# Altium footprint library sun_library.PcbLib: 412 footprints (part 24 of 26)
Each footprint in its own frame and in the unit in brackets; x right, y up, seen from the top. Pads: shape width x height; smd on the part's side, far side on the other; paste and mask are expansions set on the pad; w line width, h text height; cw(c..) or ccw(c..) is an arc to the next point about the centre after c.
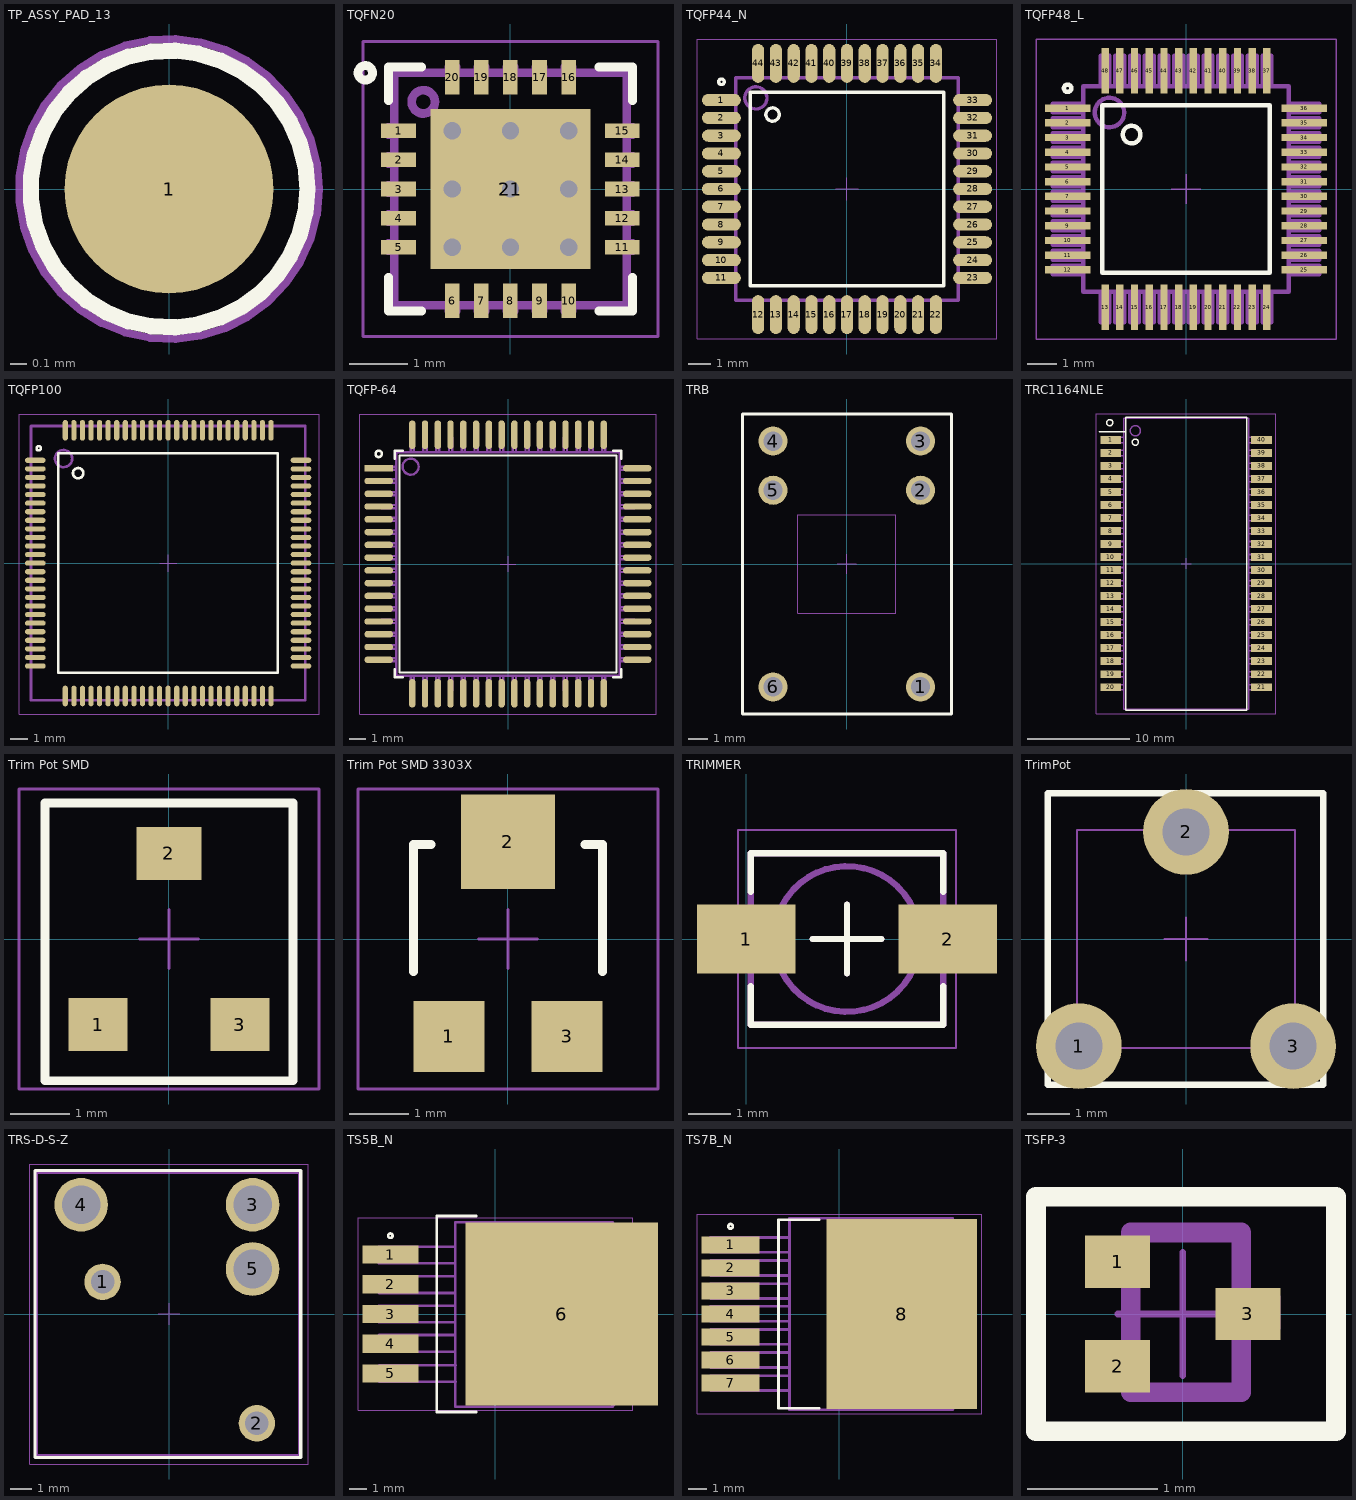
[diagram p23: the footprints below, top view; thin cyan lines are the x and y axes]

## TP_ASSY_PAD_13 [mm]
pads (1):
  round 1.3 smd paste-0.65: 1(0,0)
Top Overlay:
  circle w0.1: c0,0 r0.86
CourtTop 15:
  circle w0.05: c0,0 r0.932
3D body "Test_Pad_130x001.STEP": height 0.01, standoff 0, extent -0.65,-0.65 0.65,0.65

## TQFN20 [mm] "20-Pin Plastic Quad 4x4 Flat No-Lead 0.5 mm Pitch, IPC Low Density"
height 1
pads (21):
  rect 0.6x0.25 smd mask+0.05: 1(-1.925,1) 2(-1.925,0.5) 3(-1.925,0) 4(-1.925,-0.5) 5(-1.925,-1) 11(1.925,-1) 12(1.925,-0.5) 13(1.925,0) 14(1.925,0.5) 15(1.925,1)
  rect 0.25x0.6 smd mask+0.05: 6(-1,-1.925) 7(-0.5,-1.925) 8(0,-1.925) 9(0.5,-1.925) 10(1,-1.925) 16(1,1.925) 17(0.5,1.925) 18(0,1.925) 19(-0.5,1.925) 20(-1,1.925)
  rect 2.75x2.75 smd paste-2 mask+0.05: 21(0,0)
via 1,-1 diameter 0.6 hole 0.3
via 0,-1 diameter 0.6 hole 0.3
via -1,-1 diameter 0.6 hole 0.3
via -1,0 diameter 0.6 hole 0.3
via 0,0 diameter 0.6 hole 0.3
via 1,0 diameter 0.6 hole 0.3
via 1,1 diameter 0.6 hole 0.3
via 0,1 diameter 0.6 hole 0.3
via -1,1 diameter 0.6 hole 0.3
Top Overlay:
  circle w0.15: c-2.5,2 r0.125
  lines w0.15: -2.1,-1.525 -2.1,-2.1 -1.525,-2.1 ; -2.1,1.525 -2.1,2.1 -1.525,2.1 ; 1.525,-2.1 2.1,-2.1 2.1,-1.525 ; 1.525,2.1 2.1,2.1 2.1,1.525
Top Paste:
  rectangle: 0.1,-0.9 0.9,-0.1
  rectangle: -0.9,-0.9 -0.1,-0.1
  rectangle: 0.1,0.1 0.9,0.9
  rectangle: -0.9,0.1 -0.1,0.9
Bottom Solder:
  rectangle: -1.4,-1.4 1.4,1.4
TopAssy 13:
  circle w0.15: c-1.5,1.5 r0.2
  lines w0.15: -2.1,-1.063 -2.1,-0.938 ; -2.1,-0.563 -2.1,-0.437 ; -2.1,-0.063 -2.1,0.062 ; -2.1,0.437 -2.1,0.562 ; -2.1,0.937 -2.1,1.062 ; -1.062,-2.1 -0.937,-2.1 ; -1.062,2.1 -0.937,2.1 ; -0.562,-2.1 -0.437,-2.1 ; -0.562,2.1 -0.437,2.1 ; -0.062,-2.1 0.063,-2.1 ; -0.062,2.1 0.063,2.1 ; 0.437,-2.1 0.563,-2.1 ; 0.437,2.1 0.563,2.1 ; 0.938,-2.1 1.063,-2.1 ; 0.937,2.1 1.062,2.1 ; 2.1,-1.062 2.1,-0.937 ; 2.1,-0.562 2.1,-0.437 ; 2.1,-0.062 2.1,0.063 ; 2.1,0.437 2.1,0.563 ; 2.1,0.938 2.1,1.063 ; -2,-2 2,-2 2,2 -2,2 -2,-2
CourtTop 15:
  lines w0.05: -0.5,0 0.5,0 ; 0,-0.5 0,-0.25 0,0.25 0,0.5 ; -2.54,-2.54 2.54,-2.54 2.54,2.54 -2.54,2.54 -2.54,-2.54
3D body "User Library-qfn20-4x4.step": height 0.92, standoff 0, extent -2,-2.01 2,1.99

## TQFP44_N [mm] "Thin QFP, 44-Leads, Body 10x10mm, Pitch 0.8mm, IPC Medium Density"
height 1.2
pads (44):
  oval 1.75x0.55 smd: 1(-5.65,4) 2(-5.65,3.2) 3(-5.65,2.4) 4(-5.65,1.6) 5(-5.65,0.8) 6(-5.65,0) 7(-5.65,-0.8) 8(-5.65,-1.6) 9(-5.65,-2.4) 10(-5.65,-3.2) 11(-5.65,-4) 23(5.65,-4) 24(5.65,-3.2) 25(5.65,-2.4) 26(5.65,-1.6) 27(5.65,-0.8) 28(5.65,0) 29(5.65,0.8) 30(5.65,1.6) 31(5.65,2.4) 32(5.65,3.2) 33(5.65,4)
  oval 0.55x1.75 smd: 12(-4,-5.65) 13(-3.2,-5.65) 14(-2.4,-5.65) 15(-1.6,-5.65) 16(-0.8,-5.65) 17(0,-5.65) 18(0.8,-5.65) 19(1.6,-5.65) 20(2.4,-5.65) 21(3.2,-5.65) 22(4,-5.65) 34(4,5.65) 35(3.2,5.65) 36(2.4,5.65) 37(1.6,5.65) 38(0.8,5.65) 39(0,5.65) 40(-0.8,5.65) 41(-1.6,5.65) 42(-2.4,5.65) 43(-3.2,5.65) 44(-4,5.65)
Top Overlay:
  circle w0.15: c-5.65,4.825 r0.125
  circle w0.15: c-3.35,3.35 r0.3
  lines w0.15: -4.35,-4.35 -4.35,4.35 4.35,4.35 4.35,-4.35 -4.35,-4.35
TopAssy 13:
  circle w0.15: c-4.1,4.1 r0.5
  lines w0.15: -5,-5 -5,5 5,5 5,-5 -5,-5
CourtTop 15:
  lines w0.05: -0.5,0 0.5,0 ; 0,-0.5 0,0.5 ; -6.75,-6.75 -6.75,6.75 6.75,6.75 6.75,-6.75 -6.75,-6.75
3D body "User Library-TQFP-44.STEP": height 1.05, standoff -0.01, extent -6,-6 6,6

## TQFP48_L [mm]
pads (48):
  rect 1.55x0.25 smd mask+0.075: 1(-4.025,2.75) 2(-4.025,2.25) 3(-4.025,1.75) 4(-4.025,1.25) 5(-4.025,0.75) 6(-4.025,0.25) 7(-4.025,-0.25) 8(-4.025,-0.75) 9(-4.025,-1.25) 10(-4.025,-1.75) 11(-4.025,-2.25) 12(-4.025,-2.75) 25(4.025,-2.75) 26(4.025,-2.25) 27(4.025,-1.75) 28(4.025,-1.25) 29(4.025,-0.75) 30(4.025,-0.25) 31(4.025,0.25) 32(4.025,0.75) 33(4.025,1.25) 34(4.025,1.75) 35(4.025,2.25) 36(4.025,2.75)
  rect 0.25x1.55 smd mask+0.075: 13(-2.75,-4.025) 14(-2.25,-4.025) 15(-1.75,-4.025) 16(-1.25,-4.025) 17(-0.75,-4.025) 18(-0.25,-4.025) 19(0.25,-4.025) 20(0.75,-4.025) 21(1.25,-4.025) 22(1.75,-4.025) 23(2.25,-4.025) 24(2.75,-4.025) 37(2.75,4.025) 38(2.25,4.025) 39(1.75,4.025) 40(1.25,4.025) 41(0.75,4.025) 42(0.25,4.025) 43(-0.25,4.025) 44(-0.75,4.025) 45(-1.25,4.025) 46(-1.75,4.025) 47(-2.25,4.025) 48(-2.75,4.025)
Top Overlay:
  circle w0.15: c-1.85,1.85 r0.3
  circle w0.15: c-4.025,3.425 r0.125
  lines w0.15: -2.85,-2.85 2.85,-2.85 2.85,2.85 -2.85,2.85 -2.85,-2.85
TopAssy 13:
  circle w0.15: c-2.6,2.6 r0.5
  lines w0.15: -3.5,-2.9 -4.525,-2.9 -4.525,-2.6 -3.5,-2.6 ; -3.5,-2.4 -4.525,-2.4 -4.525,-2.1 -3.5,-2.1 ; -3.5,-1.9 -4.525,-1.9 -4.525,-1.6 -3.5,-1.6 ; -3.5,-1.4 -4.525,-1.4 -4.525,-1.1 -3.5,-1.1 ; -3.5,-0.9 -4.525,-0.9 -4.525,-0.6 -3.5,-0.6 ; -3.5,-0.4 -4.525,-0.4 -4.525,-0.1 -3.5,-0.1 ; -3.5,0.1 -4.525,0.1 -4.525,0.4 -3.5,0.4 ; -3.5,0.6 -4.525,0.6 -4.525,0.9 -3.5,0.9 ; -3.5,1.1 -4.525,1.1 -4.525,1.4 -3.5,1.4 ; -3.5,1.6 -4.525,1.6 -4.525,1.9 -3.5,1.9 ; -3.5,2.1 -4.525,2.1 -4.525,2.4 -3.5,2.4 ; -3.5,2.6 -4.525,2.6 -4.525,2.9 -3.5,2.9 ; -2.9,-3.5 -2.9,-4.525 -2.6,-4.525 -2.6,-3.5 ; -2.9,3.5 -2.9,4.525 -2.6,4.525 -2.6,3.5 ; -2.4,-3.5 -2.4,-4.525 -2.1,-4.525 -2.1,-3.5 ; -2.4,3.5 -2.4,4.525 -2.1,4.525 -2.1,3.5 ; -1.9,-3.5 -1.9,-4.525 -1.6,-4.525 -1.6,-3.5 ; -1.9,3.5 -1.9,4.525 -1.6,4.525 -1.6,3.5 ; -1.4,-3.5 -1.4,-4.525 -1.1,-4.525 -1.1,-3.5 ; -1.4,3.5 -1.4,4.525 -1.1,4.525 -1.1,3.5 ; -0.9,-3.5 -0.9,-4.525 -0.6,-4.525 -0.6,-3.5 ; -0.9,3.5 -0.9,4.525 -0.6,4.525 -0.6,3.5 ; -0.4,-3.5 -0.4,-4.525 -0.1,-4.525 -0.1,-3.5 ; -0.4,3.5 -0.4,4.525 -0.1,4.525 -0.1,3.5 ; 0.1,-3.5 0.1,-4.525 0.4,-4.525 0.4,-3.5 ; 0.1,3.5 0.1,4.525 0.4,4.525 0.4,3.5 ; 0.6,-3.5 0.6,-4.525 0.9,-4.525 0.9,-3.5 ; 0.6,3.5 0.6,4.525 0.9,4.525 0.9,3.5 ; 1.1,-3.5 1.1,-4.525 1.4,-4.525 1.4,-3.5 ; 1.1,3.5 1.1,4.525 1.4,4.525 1.4,3.5 ; 1.6,-3.5 1.6,-4.525 1.9,-4.525 1.9,-3.5 ; 1.6,3.5 1.6,4.525 1.9,4.525 1.9,3.5 ; 2.1,-3.5 2.1,-4.525 2.4,-4.525 2.4,-3.5 ; 2.1,3.5 2.1,4.525 2.4,4.525 2.4,3.5 ; 2.6,-3.5 2.6,-4.525 2.9,-4.525 2.9,-3.5 ; 2.6,3.5 2.6,4.525 2.9,4.525 2.9,3.5 ; 3.5,-2.9 4.525,-2.9 4.525,-2.6 3.5,-2.6 ; 3.5,-2.4 4.525,-2.4 4.525,-2.1 3.5,-2.1 ; 3.5,-1.9 4.525,-1.9 4.525,-1.6 3.5,-1.6 ; 3.5,-1.4 4.525,-1.4 4.525,-1.1 3.5,-1.1 ; 3.5,-0.9 4.525,-0.9 4.525,-0.6 3.5,-0.6 ; 3.5,-0.4 4.525,-0.4 4.525,-0.1 3.5,-0.1 ; 3.5,0.1 4.525,0.1 4.525,0.4 3.5,0.4 ; 3.5,0.6 4.525,0.6 4.525,0.9 3.5,0.9 ; 3.5,1.1 4.525,1.1 4.525,1.4 3.5,1.4 ; 3.5,1.6 4.525,1.6 4.525,1.9 3.5,1.9 ; 3.5,2.1 4.525,2.1 4.525,2.4 3.5,2.4 ; 3.5,2.6 4.525,2.6 4.525,2.9 3.5,2.9 ; -3.5,-3.5 3.5,-3.5 3.5,3.5 -3.5,3.5 -3.5,-3.5
CourtTop 15:
  lines w0.05: -0.5,0 0.5,0 ; 0,-0.5 0,0.5 ; -5.1,-5.1 5.1,-5.1 5.1,5.1 -5.1,5.1 -5.1,-5.1
3D body "User Library-TQFP-48.STEP": height 1.45, standoff -0.01, extent -4.5,-4.5 4.5,4.5

## TQFP100 [mm] "Thin QFP, 100-Leads, Body 14x14mm, Pitch 0.5mm, IPC Medium Density"
height 1.6
pads (100):
  oval 1.2x0.3 smd: 1(-7.75,6) 2(-7.75,5.5) 3(-7.75,5) 4(-7.75,4.5) 5(-7.75,4) 6(-7.75,3.5) 7(-7.75,3) 8(-7.75,2.5) 9(-7.75,2) 10(-7.75,1.5) 11(-7.75,1) 12(-7.75,0.5) 13(-7.75,0) 14(-7.75,-0.5) 15(-7.75,-1) 16(-7.75,-1.5) 17(-7.75,-2) 18(-7.75,-2.5) 19(-7.75,-3) 20(-7.75,-3.5) 21(-7.75,-4) 22(-7.75,-4.5) 23(-7.75,-5) 24(-7.75,-5.5) 25(-7.75,-6) 51(7.75,-6) 52(7.75,-5.5) 53(7.75,-5) 54(7.75,-4.5) 55(7.75,-4) 56(7.75,-3.5) 57(7.75,-3) 58(7.75,-2.5) 59(7.75,-2) 60(7.75,-1.5) 61(7.75,-1) 62(7.75,-0.5) 63(7.75,0) 64(7.75,0.5) 65(7.75,1) 66(7.75,1.5) 67(7.75,2) 68(7.75,2.5) 69(7.75,3) 70(7.75,3.5) 71(7.75,4) 72(7.75,4.5) 73(7.75,5) 74(7.75,5.5) 75(7.75,6)
  oval 0.3x1.2 smd: 26(-6,-7.75) 27(-5.5,-7.75) 28(-5,-7.75) 29(-4.5,-7.75) 30(-4,-7.75) 31(-3.5,-7.75) 32(-3,-7.75) 33(-2.5,-7.75) 34(-2,-7.75) 35(-1.5,-7.75) 36(-1,-7.75) 37(-0.5,-7.75) 38(0,-7.75) 39(0.5,-7.75) 40(1,-7.75) 41(1.5,-7.75) 42(2,-7.75) 43(2.5,-7.75) 44(3,-7.75) 45(3.5,-7.75) 46(4,-7.75) 47(4.5,-7.75) 48(5,-7.75) 49(5.5,-7.75) 50(6,-7.75) 76(6,7.75) 77(5.5,7.75) 78(5,7.75) 79(4.5,7.75) 80(4,7.75) 81(3.5,7.75) 82(3,7.75) 83(2.5,7.75) 84(2,7.75) 85(1.5,7.75) 86(1,7.75) 87(0.5,7.75) 88(0,7.75) 89(-0.5,7.75) 90(-1,7.75) 91(-1.5,7.75) 92(-2,7.75) 93(-2.5,7.75) 94(-3,7.75) 95(-3.5,7.75) 96(-4,7.75) 97(-4.5,7.75) 98(-5,7.75) 99(-5.5,7.75) 100(-6,7.75)
Top Overlay:
  circle w0.15: c-7.55,6.7 r0.125
  circle w0.15: c-5.25,5.25 r0.3
  lines w0.15: -6.4,-6.4 -6.4,6.4 6.4,6.4 6.4,-6.4 -6.4,-6.4
TopAssy 13:
  circle w0.15: c-6.1,6.1 r0.5
  lines w0.15: -8,-8 -8,8 8,8 8,-8 -8,-8
CourtTop 15:
  lines w0.05: -0.5,0 0.5,0 ; 0,-0.5 0,0.5 ; -8.7,-8.8 -8.7,8.7 8.8,8.7 8.8,-8.8 -8.7,-8.8
3D body "User Library-TQFP100-2.step": height 1.1, standoff 0, extent -8.009,-8.008 8.009,8.009

## TQFP-64 [mm]
pads (64):
  rect 1.8x0.4 smd: 1(-8.1,6)
  oval 1.8x0.4 smd: 2(-8.1,5.2) 3(-8.1,4.4) 4(-8.1,3.6) 5(-8.1,2.8) 6(-8.1,2) 7(-8.1,1.2) 8(-8.1,0.4) 9(-8.1,-0.4) 10(-8.1,-1.2) 11(-8.1,-2) 12(-8.1,-2.8) 13(-8.1,-3.6) 14(-8.1,-4.4) 15(-8.1,-5.2) 16(-8.1,-6) 33(8.1,-6) 34(8.1,-5.2) 35(8.1,-4.4) 36(8.1,-3.6) 37(8.1,-2.8) 38(8.1,-2) 39(8.1,-1.2) 40(8.1,-0.4) 41(8.1,0.4) 42(8.1,1.2) 43(8.1,2) 44(8.1,2.8) 45(8.1,3.6) 46(8.1,4.4) 47(8.1,5.2) 48(8.1,6)
  oval 0.4x1.8 smd: 17(-6,-8.1) 18(-5.2,-8.1) 19(-4.4,-8.1) 20(-3.6,-8.1) 21(-2.8,-8.1) 22(-2,-8.1) 23(-1.2,-8.1) 24(-0.4,-8.1) 25(0.4,-8.1) 26(1.2,-8.1) 27(2,-8.1) 28(2.8,-8.1) 29(3.6,-8.1) 30(4.4,-8.1) 31(5.2,-8.1) 32(6,-8.1) 49(6,8.1) 50(5.2,8.1) 51(4.4,8.1) 52(3.6,8.1) 53(2.8,8.1) 54(2,8.1) 55(1.2,8.1) 56(0.4,8.1) 57(-0.4,8.1) 58(-1.2,8.1) 59(-2,8.1) 60(-2.8,8.1) 61(-3.6,8.1) 62(-4.4,8.1) 63(-5.2,8.1) 64(-6,8.1)
Top Overlay:
  circle w0.15: c-8.1,6.9 r0.2
  lines w0.15: -7.1,-6.6 -7.1,-7.1 -6.6,-7.1 ; -7.1,6.6 -7.1,7.1 -6.6,7.1 ; 6.6,-7.1 7.1,-7.1 7.1,-6.6 ; 6.6,7.1 7.1,7.1 7.1,6.6 ; -6.8,-6.8 -6.8,6.8 6.8,6.8 6.8,-6.8 -6.8,-6.8
TopAssy 13:
  drawing of 261 lines, arcs and shapes, not listed
CourtTop 15:
  lines w0.05: -0.5,0 0.5,0 ; 0,-0.5 0,0.5 ; -9.3,-9.4 9.3,-9.4 9.3,9.4 -9.3,9.4 -9.3,-9.4
3D body "User Library-TQFP 64 14x14mm 0_8mm pitch.step": height 1.5, standoff 0, extent -8,-8 8,8

## TRB [mm] "Реле серии TRB производитель TII"
height 11.8
pads (6):
  round 1.5 hole 1: 1(3.81,-6.35) 2(3.81,3.81) 3(3.81,6.35) 4(-3.81,6.35) 5(-3.81,3.81) 6(-3.81,-6.35)
Top Overlay:
  lines w0.15: -5.39,-7.75 -5.39,7.75 5.41,7.75 5.41,-7.75 -5.39,-7.75
CourtTop 15:
  lines w0.05: -0.5,0 0.5,0 ; 0,-0.5 0,-0.25 0,0.25 0,0.5 ; -2.54,-2.54 -2.54,2.54 2.54,2.54 2.54,-2.54 -2.54,-2.54

## TRC1164NLE [mm] "Ethernet transformer TRC1164NLE Trxcom"
height 1.1
pads (40):
  rect 2.03x0.76 smd: 1(-7.365,12.065) 2(-7.365,10.795) 3(-7.365,9.525) 4(-7.365,8.255) 5(-7.365,6.985) 6(-7.365,5.715) 7(-7.365,4.445) 8(-7.365,3.175) 9(-7.365,1.905) 10(-7.365,0.635) 11(-7.365,-0.635) 12(-7.365,-1.905) 13(-7.365,-3.175) 14(-7.365,-4.445) 15(-7.365,-5.715) 16(-7.365,-6.985) 17(-7.365,-8.255) 18(-7.365,-9.525) 19(-7.365,-10.795) 20(-7.365,-12.065) 21(7.365,-12.065) 22(7.365,-10.795) 23(7.365,-9.525) 24(7.365,-8.255) 25(7.365,-6.985) 26(7.365,-5.715) 27(7.365,-4.445) 28(7.365,-3.175) 29(7.365,-1.905) 30(7.365,-0.635) 31(7.365,0.635) 32(7.365,1.905) 33(7.365,3.175) 34(7.365,4.445) 35(7.365,5.715) 36(7.365,6.985) 37(7.365,8.255) 38(7.365,9.525) 39(7.365,10.795) 40(7.365,12.065)
Top Overlay:
  circle w0.15: c-7.465,13.75 r0.3
  circle w0.15: c-4.965,11.85 r0.3
  lines w0.15: -8.465,12.85 -5.965,12.85 ; -5.9,-14.3 -5.9,14.3 5.9,14.3 5.9,-14.3 -5.9,-14.3
TopAssy 13:
  drawing of 325 lines, arcs and shapes, not listed
CourtTop 15:
  lines w0.05: -0.5,0 0.5,0 ; 0,-0.5 0,0.5 ; -8.765,-14.685 -8.765,14.6 8.735,14.6 8.735,-14.685 -8.765,-14.685
3D body "SM51589EL.STP": height 6.01, standoff 0.01, extent -7.875,-13.835 8.075,3.715
3D body "SM51589EL.STP": height 6.01, standoff 0.01, extent -7.875,-3.675 8.075,13.875

## Trim Pot SMD [mm]
pads (3):
  rect 1x0.9 smd: 1(-1.2,-1.45) 3(1.2,-1.45)
  rect 1.1x0.9 smd: 2(0,1.45)
Top Overlay:
  lines w0.15: -2.1,-2.4 2.1,-2.4 2.1,2.3 -2.1,2.3 -2.1,-2.4
CourtTop 15:
  lines w0.05: -0.5,0 0.5,0 ; 0,-0.5 0,-0.25 0,0.25 0,0.5 ; -2.54,-2.54 2.54,-2.54 2.54,2.54 -2.54,2.54 -2.54,-2.54

## Trim Pot SMD 3303X [mm] "Bourns 3303X - 3 mm SMD Trimming Potentiometer"
height 1.62
pads (3):
  rect 1.2x1.2 smd: 1(-1,-1.65) 3(1,-1.65)
  rect 1.6x1.6 smd: 2(0,1.65)
Top Overlay:
  lines w0.15: -1.6,-0.55 -1.6,1.6 -1.3,1.6 ; 1.3,1.6 1.6,1.6 1.6,-0.55
CourtTop 15:
  lines w0.05: -0.5,0 0.5,0 ; 0,-0.5 0,-0.25 0,0.25 0,0.5 ; -2.54,-2.54 2.54,-2.54 2.54,2.54 -2.54,2.54 -2.54,-2.54
3D body "3303X003.stp": height 1.31, standoff -0.04, extent -1.5,-1.923 1.497,1.823

## TRIMMER [mm]
pads (2):
  rect 2.3x1.6 smd: 1(0,0) 2(4.7,0)
Top Overlay:
  lines w0.15: 0.1,-1.1 0.1,-2 4.6,-2 4.6,-1.1 ; 0.1,1.1 0.1,2 4.6,2 4.6,1.1 ; 1.55,0 3.15,0 ; 2.35,-0.8 2.35,0.8
TopAssy 13:
  circle w0.15: c2.35,0 r1.701
  lines w0.15: 0.1,-0.6 -0.25,-0.6 -0.25,0.6 0.1,0.6 ; 1.55,0 3.15,0 ; 2.35,-0.8 2.35,0.8 ; 4.6,-0.6 4.95,-0.6 4.95,0.6 4.6,0.6 ; 0.1,-2 0.1,2 4.6,2 4.6,-2 0.1,-2
CourtTop 15:
  lines w0.05: 1.85,0 2.85,0 ; 2.35,-0.5 2.35,-0.25 2.35,0.25 2.35,0.5 ; -0.19,-2.54 4.89,-2.54 4.89,2.54 -0.19,2.54 -0.19,-2.54
3D body "SW3dPS-TRIMMER_PVG3A.STEP": height 2, standoff 0, extent 0.4,-1.7 4,1.7

## TrimPot [mm]
pads (3):
  round 2 hole 1.1: 1(-2.5,-2.5) 2(0,2.5) 3(2.5,-2.5)
Top Overlay:
  lines w0.15: -3.226,-3.4 -3.226,3.4 ; -3.2,-3.4 3.2,-3.4 3.2,3.4 -3.2,3.4
CourtTop 15:
  lines w0.05: -0.5,0 0.5,0 ; 0,-0.5 0,-0.25 0,0.25 0,0.5 ; -2.54,-2.54 2.54,-2.54 2.54,2.54 -2.54,2.54 -2.54,-2.54

## TRS-D-S-Z [mm] "Relay 30A TIANBO TRS-D-S-Z/12VDC 12.3x13.2x9.8mm"
height 9.8
pads (5):
  round 1.7 hole 1.1: 1(-3.1,1.5) 2(4.1,-5.1)
  round 2.5 hole 1.8: 3(3.9,5.1) 4(-4.1,5.1) 5(3.9,2.1)
Top Overlay:
  lines w0.15: -6.25,-6.7 -6.25,6.7 6.15,6.7 6.15,-6.7 -6.25,-6.7
TopAssy 13:
  lines w0.15: -6.2,-6.6 6.1,-6.6 6.1,6.6 -6.2,6.6 -6.2,-6.6
CourtTop 15:
  lines w0.05: -0.5,0 0.5,0 ; 0,-0.5 0,-0.25 0,0.25 0,0.5 ; -6.5,-7 6.5,-7 6.5,7 -6.5,7 -6.5,-7
3D body "relay_tianbo_trs.STEP": height 9.8, standoff -3.1, extent -6.25,-6.65 6.05,6.55

## TS5B_N [mm] "D2-PAK, 6-Leads, Body 8.6x10.2mm, Pitch 1.7mm, Lead Span 14.1mm, IPC Medium Density"
height 4.65
pads (6):
  rect 3.2x1.05 smd: 1(-6,3.4) 2(-6,1.7) 3(-6,0) 4(-6,-1.7) 5(-6,-3.4)
  rect 11x10.45 smd: 6(3.8,0)
Top Overlay:
  circle w0.15: c-6,4.475 r0.125
  lines w0.15: -1.1,-5.6 -3.35,-5.6 -3.35,5.6 -1.1,5.6
TopAssy 13:
  lines w0.15: -2.3,-2.15 -6.65,-2.15 -6.65,-1.2 -2.3,-1.2 ; -2.3,-0.475 -6.65,-0.475 -6.65,0.475 -2.3,0.475 ; -2.3,1.2 -6.65,1.2 -6.65,2.15 -2.3,2.15 ; -2.3,2.9 -6.65,2.9 -6.65,3.85 -2.3,3.85 ; -2.275,-3.875 -6.625,-3.875 -6.625,-2.925 -2.275,-2.925 ; 6.7,-5.3 7.75,-4.25 7.75,4.175 6.7,5.225 6.7,5.25 ; 6.7,-5.3 6.7,5.25 ; 6.7,-5.3 -2.3,-5.3 -2.3,5.25 6.7,5.25
CourtTop 15:
  lines w0.05: -0.5,0 0.5,0 ; 0,-0.5 0,0.5 ; -7.85,-5.5 7.85,-5.5 7.85,5.5 -7.85,5.5 -7.85,-5.5
3D body "SW3dPS-TO263-5.STEP": height 4.78, standoff -0.02, extent -7.335,-5 8.335,5

## TS7B_N [mm] "D2-PAK, 8-Leads, Body 8.6x10.2mm, Pitch 1.27mm, Lead Span 14.1mm, IPC Medium Density"
height 4.64
pads (8):
  rect 3.2x0.95 smd: 1(-6,3.81) 2(-6,2.54) 3(-6,1.27) 4(-6,0) 5(-6,-1.27) 6(-6,-2.54) 7(-6,-3.81)
  rect 8.3x10.5 smd: 8(3.45,0)
Top Overlay:
  circle w0.15: c-6,4.835 r0.125
  lines w0.15: -1.1,-5.2 -3.35,-5.2 -3.35,5.2 -1.1,5.2
TopAssy 13:
  lines w0.15: -2.775,3.4 -7.125,3.4 -7.125,4.225 -2.775,4.225 ; -2.75,-4.225 -7.1,-4.225 -7.1,-3.4 -2.75,-3.4 ; -2.75,-2.95 -7.1,-2.95 -7.1,-2.125 -2.75,-2.125 ; -2.75,-1.675 -7.1,-1.675 -7.1,-0.85 -2.75,-0.85 ; -2.75,-0.4 -7.1,-0.4 -7.1,0.425 -2.75,0.425 ; -2.75,0.85 -7.1,0.85 -7.1,1.675 -2.75,1.675 ; -2.75,2.125 -7.1,2.125 -7.1,2.95 -2.75,2.95 ; 6.25,-5.275 7.3,-4.225 7.3,4.2 6.25,5.25 6.25,5.275 ; 6.25,-5.275 6.25,5.275 ; 6.25,-5.275 -2.75,-5.275 -2.75,5.275 6.25,5.275
CourtTop 15:
  lines w0.05: -0.5,0 0.5,0 ; 0,-0.5 0,0.5 ; -7.85,-5.5 7.85,-5.5 7.85,5.5 -7.85,5.5 -7.85,-5.5
3D body: height 4.64, standoff 0, extent -3.35,-5.2 6.05,5.2

## TSFP-3 [mm]
pads (3):
  rect 0.5x0.4 smd: 1(-0.5,0.4) 2(-0.5,-0.4) 3(0.5,0)
Top Overlay:
  lines w0.15: -1.125,-0.9 -1.125,0.9 1.175,0.9 1.175,-0.9 -1.125,-0.9
TopAssy 13:
  lines w0.15: -0.4,-0.5 -0.625,-0.5 -0.625,-0.275 -0.4,-0.275 ; -0.4,0.275 -0.625,0.275 -0.625,0.5 -0.4,0.5 ; 0.45,-0.1 0.675,-0.1 0.675,0.125 0.45,0.125 ; -0.4,-0.6 -0.4,0.625 0.45,0.625 0.45,-0.6 -0.4,-0.6
CourtTop 15:
  lines w0.05: -0.5,0 0.5,0 ; 0,-0.475 0,0.475 ; -1.125,-0.875 -1.125,0.9 1.15,0.9 1.15,-0.875 -1.125,-0.875
3D body "User Library-TSFP-3.step": height 0.42, standoff 0.02, extent -0.625,-0.625 0.625,0.625